# Altium footprint library Tienanh.PcbLib: 190 footprints (part 9 of 12)
Each footprint in its own frame and in the unit in brackets; x right, y up, seen from the top. Pads: shape width x height; smd on the part's side, far side on the other; paste and mask are expansions set on the pad; w line width, h text height; cw(c..) or ccw(c..) is an arc to the next point about the centre after c.
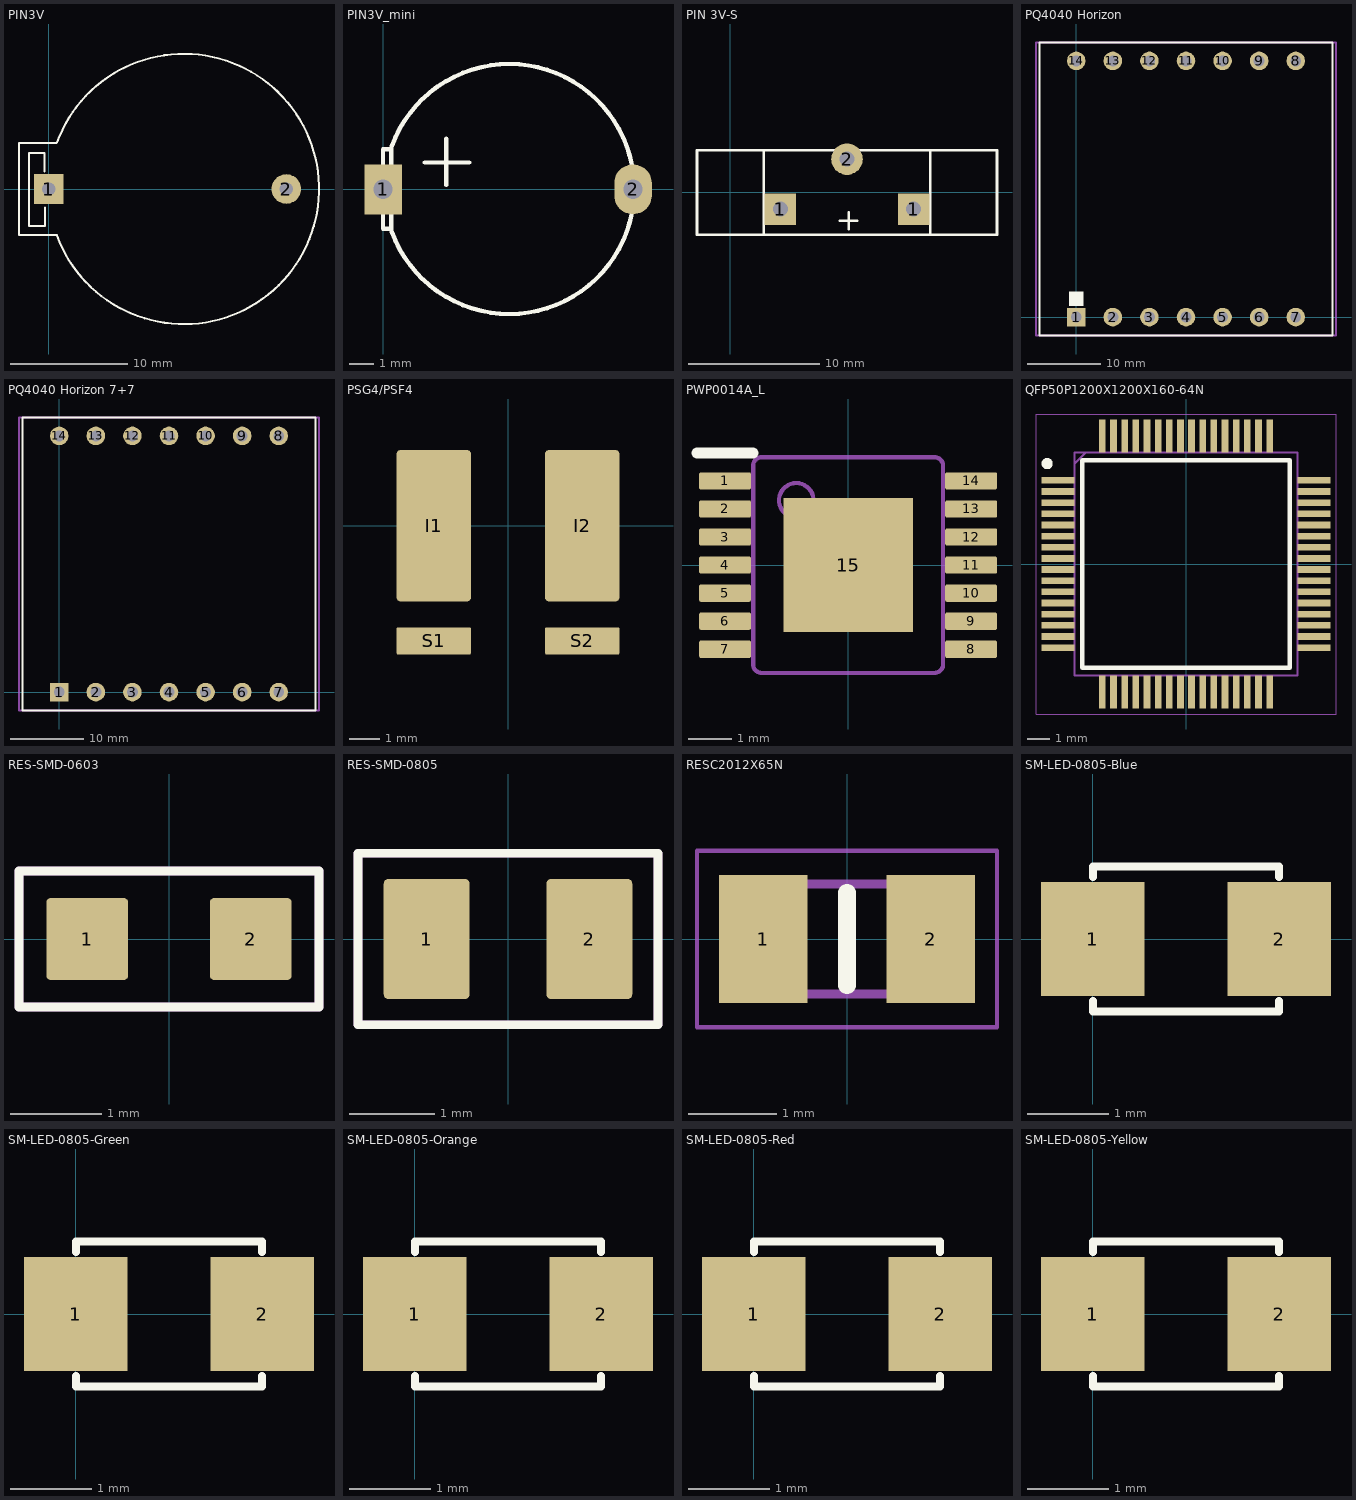
[diagram p8: the footprints below, top view; thin cyan lines are the x and y axes]

## PIN3V [mil] "Socket PIN 3V"
pads (2):
  rect 100x100 hole 45: 1(0,0)
  round 100 hole 45: 2(800,0)
Top Overlay:
  lines w7: -14,59 -14,121 -66,121 -66,-124 -13,-124 -13,-63 ; 26.33,155 -100,155 -100,-155 27.93,-155 ; 27.6,156.07 cw(c455,0) 27.93,-156.97
3D body "batter2.STEP": height 278.16, standoff -137.2, extent -128.09,-446.83 1001.83,448.83

## PIN3V_mini [mil] "Socket PIN 3V"
pads (2):
  rect 60x80 hole 31: 1(0,0)
  oval 60x80 hole 31: 2(400,0)
Top Overlay:
  lines w7: 11,64 0,64 0,-63 13,-63 ; 13,-64 13,65 ; 14,-67.81 ccw(c201.94,0.6) 14,69 ; 67,43 138,43 ; 101,7 101,81

## PIN 3V-S [mil] "Socket PIN 3V"
pads (3):
  rect 95x95 hole 45: 1(150,-50) 1(550,-50)
  round 95 hole 45: 2(350,100)
Top Overlay:
  lines w8: 100,-127 100,127 ; 329,-85 380,-85 ; 355,-110 355,-60 ; 600,-127 600,127 ; -100,-127 800,-127 800,127 -100,127 -100,-127

## PQ4040 Horizon [mm] "7+7 pin"
pads (14):
  rect 2.54x2.54 hole 1.5: 1(0,0)
  round 2.54 hole 1.5: 2(5,0) 3(10,0) 4(15,0) 5(20,0) 6(25,0) 7(30,0) 8(30,35) 9(25,35) 10(20,35) 11(15,35) 12(10,35) 13(5,35) 14(0,35)
Top Overlay:
  rectangle: -1,1.5 1,3.5
  lines w0.254: -5,-2.5 35,-2.5 35,37.5 -5,37.5 -5,-2.5
Mechanical 15:
  lines w0.254: -5.5,-2.5 35.5,-2.5 35.5,37.5 -5.5,37.5 -5.5,-2.5
3D body "User Library-PQ4040H-8+8.STEP": height 38, standoff -3.55, extent -5.5,-2.5 35.2,37.5

## PQ4040 Horizon 7+7 [mm]
pads (14):
  rect 2.54x2.54 hole 1.5: 1(0,0)
  round 2.54 hole 1.5: 2(5,0) 3(10,0) 4(15,0) 5(20,0) 6(25,0) 7(30,0) 8(30,35) 9(25,35) 10(20,35) 11(15,35) 12(10,35) 13(5,35) 14(0,35)
Top Overlay:
  lines w0.254: -5,-2.5 35,-2.5 35,37.5 -5,37.5 -5,-2.5
Mechanical 15:
  lines w0.254: -5.5,-2.5 35.5,-2.5 35.5,37.5 -5.5,37.5 -5.5,-2.5
3D body "User Library-PQ4040H-8+8.STEP": height 38, standoff -3.55, extent -5.5,-2.5 35.2,37.5

## PSG4/PSF4 [mm] "Chip Capacitor, Body 3.2x2.5mm, IPC Medium Density"
height 1.35
pads (4):
  rrect10% 2.45x5 smd mask+0.07: I1(-2.45,0) I2(2.45,0)
  rrect10% 2.45x0.9 smd mask+0.07: S1(-2.45,-3.8) S2(2.45,-3.8)
3D body: height 3, standoff 0, extent -3.45,-4.15 3.45,2.45

## PWP0014A_L [mm]
pads (15):
  rrect20% 1.2x0.4 smd mask+0.07: 1(-2.85,1.95) 2(-2.85,1.3) 3(-2.85,0.65) 4(-2.85,0) 5(-2.85,-0.65) 6(-2.85,-1.3) 7(-2.85,-1.95) 8(2.85,-1.95) 9(2.85,-1.3) 10(2.85,-0.65) 11(2.85,0) 12(2.85,0.65) 13(2.85,1.3) 14(2.85,1.95)
  rect 3x3.1 smd: 15(0,0)
Top Overlay:
  lines w0.254: -3.5,2.6 -2.2,2.6
Mechanical 1:
  lines w0.1: -2.2,-2.06 -3.209,-2.06 -3.209,-1.84 -2.2,-1.84 ; -2.2,-1.41 -3.209,-1.41 -3.209,-1.19 -2.2,-1.19 ; -2.2,-0.76 -3.209,-0.76 -3.209,-0.54 -2.2,-0.54 ; -2.2,-0.11 -3.209,-0.11 -3.209,0.11 -2.2,0.11 ; -2.2,0.54 -3.209,0.54 -3.209,0.76 -2.2,0.76 ; -2.2,1.19 -3.209,1.19 -3.209,1.41 -2.2,1.41 ; -2.2,1.84 -3.209,1.84 -3.209,2.06 -2.2,2.06 ; 2.2,-2.06 3.209,-2.06 3.209,-1.84 2.2,-1.84 ; 2.2,-1.41 3.209,-1.41 3.209,-1.19 2.2,-1.19 ; 2.2,-0.76 3.209,-0.76 3.209,-0.54 2.2,-0.54 ; 2.2,-0.11 3.209,-0.11 3.209,0.11 2.2,0.11 ; 2.2,0.54 3.209,0.54 3.209,0.76 2.2,0.76 ; 2.2,1.19 3.209,1.19 3.209,1.41 2.2,1.41 ; 2.2,1.84 3.209,1.84 3.209,2.06 2.2,2.06 ; -2.2,-2.3 ccw(c-2,-2.3) -2,-2.5 2,-2.5 ccw(c2,-2.3) 2.2,-2.3 2.2,2.3 ccw(c2,2.3) 2,2.5 -2,2.5 ccw(c-2,2.3) -2.2,2.3 -2.2,-2.3 ; -1.2,1.1 cw(c-1.2,1.5) -1.2,1.9 cw(c-1.2,1.5) -1.2,1.1
3D body "PWP0014A.stp": height 1, standoff 0, extent -3.21,-2.5 3.211,2.5

## QFP50P1200X1200X160-64N [mm]
pads (64):
  rect 1.475x0.3 smd: 1(-5.738,3.75) 2(-5.738,3.25) 3(-5.738,2.75) 4(-5.738,2.25) 5(-5.738,1.75) 6(-5.738,1.25) 7(-5.738,0.75) 8(-5.738,0.25) 9(-5.738,-0.25) 10(-5.738,-0.75) 11(-5.738,-1.25) 12(-5.738,-1.75) 13(-5.738,-2.25) 14(-5.738,-2.75) 15(-5.738,-3.25) 16(-5.738,-3.75) 33(5.738,-3.75) 34(5.738,-3.25) 35(5.738,-2.75) 36(5.738,-2.25) 37(5.738,-1.75) 38(5.738,-1.25) 39(5.738,-0.75) 40(5.738,-0.25) 41(5.738,0.25) 42(5.738,0.75) 43(5.738,1.25) 44(5.738,1.75) 45(5.738,2.25) 46(5.738,2.75) 47(5.738,3.25) 48(5.738,3.75)
  rect 0.3x1.475 smd: 17(-3.75,-5.738) 18(-3.25,-5.738) 19(-2.75,-5.738) 20(-2.25,-5.738) 21(-1.75,-5.738) 22(-1.25,-5.738) 23(-0.75,-5.738) 24(-0.25,-5.738) 25(0.25,-5.738) 26(0.75,-5.738) 27(1.25,-5.738) 28(1.75,-5.738) 29(2.25,-5.738) 30(2.75,-5.738) 31(3.25,-5.738) 32(3.75,-5.738) 49(3.75,5.738) 50(3.25,5.738) 51(2.75,5.738) 52(2.25,5.738) 53(1.75,5.738) 54(1.25,5.738) 55(0.75,5.738) 56(0.25,5.738) 57(-0.25,5.738) 58(-0.75,5.738) 59(-1.25,5.738) 60(-1.75,5.738) 61(-2.25,5.738) 62(-2.75,5.738) 63(-3.25,5.738) 64(-3.75,5.738)
Top Overlay:
  circle w0.25: c-6.225,4.5 r0.125
  lines w0.2: -4.65,-4.65 -4.65,4.65 4.65,4.65 4.65,-4.65 -4.65,-4.65
Mechanical 13:
  lines w0.1: -5,4.5 -4.5,5 ; -5,-5 -5,5 5,5 5,-5 -5,-5
Mechanical 15:
  lines w0.05: -6.725,-6.725 -6.725,6.725 6.725,6.725 6.725,-6.725 -6.725,-6.725
3D body "STM32G491RET6.stp": height 1.6, standoff 0, extent -6,-6 6,6

## RES-SMD-0603 [mm]
pads (2):
  rrect10% 0.9x0.9 smd mask+0.07: 1(-0.9,0) 2(0.9,0)
Top Overlay:
  lines w0.1: -1.65,-0.75 -1.65,0.75 1.65,0.75 1.65,-0.75 -1.65,-0.75
Top Assembly:
  lines w0.1: -1.65,-0.75 -1.65,0.75 1.65,0.75 1.65,-0.75 -1.65,-0.75
3D body "RES0603.step": height 0.56, standoff 0, extent -0.85,-0.4 0.85,0.4

## RES-SMD-0805 [mm]
pads (2):
  rrect10% 1x1.4 smd mask+0.07: 1(-0.95,0) 2(0.95,0)
Top Overlay:
  lines w0.1: -1.75,-1 1.75,-1 1.75,1 -1.75,1 -1.75,-1
Top Assembly:
  lines w0.1: -1.75,-1 1.75,-1 1.75,1 -1.75,1 -1.75,-1
3D body "User Library-RES_2013-0805.step": height 0.76, standoff 0, extent -1.15,-0.695 1.15,0.655

## RESC2012X65N [mm]
pads (2):
  rect 1x1.45 smd: 1(-0.95,0) 2(0.95,0)
Top Overlay:
  lines w0.2: 0,-0.525 0,0.525
Mechanical 13:
  lines w0.1: -1,-0.625 -1,0.625 1,0.625 1,-0.625 -1,-0.625
Mechanical 15:
  lines w0.05: -1.7,-1 -1.7,1 1.7,1 1.7,-1 -1.7,-1
3D body "CPF0805B100RE1.stp": height 0.65, standoff 0, extent -1,-0.625 1,0.625

## SM-LED-0805-Blue [mil]
pads (2):
  rect 50x55 smd: 1(0,0) 2(90,0)
Top Overlay:
  lines w4: 0,-30 0,-35 90,-35 90,-30 ; 0,30 0,35 90,35 90,30
3D body "User Library-led_0805-blue.step": height 43.31, standoff 0, extent 5.24,-24.6 84.77,24.61

## SM-LED-0805-Green [mil]
pads (2):
  rect 50x55 smd: 1(0,0) 2(90,0)
Top Overlay:
  lines w4: 0,-30 0,-35 90,-35 90,-30 ; 0,30 0,35 90,35 90,30
3D body "User Library-led_0805-Green.step": height 43.31, standoff 0, extent 5.24,-24.6 84.77,24.61

## SM-LED-0805-Orange [mil]
pads (2):
  rect 50x55 smd: 1(0,0) 2(90,0)
Top Overlay:
  lines w4: 0,-30 0,-35 90,-35 90,-30 ; 0,30 0,35 90,35 90,30
3D body "User Library-led_0805-orange.step": height 43.31, standoff 0, extent 5.24,-24.59 84.77,24.62

## SM-LED-0805-Red [mil]
pads (2):
  rect 50x55 smd: 1(0,0) 2(90,0)
Top Overlay:
  lines w4: 0,-30 0,-35 90,-35 90,-30 ; 0,30 0,35 90,35 90,30
3D body "User Library-led_0805-red.step": height 43.31, standoff 0, extent 5.25,-24.6 84.77,24.62

## SM-LED-0805-Yellow [mil]
pads (2):
  rect 50x55 smd: 1(0,0) 2(90,0)
Top Overlay:
  lines w4: 0,-30 0,-35 90,-35 90,-30 ; 0,30 0,35 90,35 90,30
3D body "User Library-led_0805-yellow.step": height 43.31, standoff 0, extent 5.25,-24.6 84.77,24.62